# Altium footprint library connectors_socets.pcblib: 567 footprints (part 1 of 36)
Each footprint in its own frame and in the unit in brackets; x right, y up, seen from the top. Pads: shape width x height; smd on the part's side, far side on the other; paste and mask are expansions set on the pad; w line width, h text height; cw(c..) or ccw(c..) is an arc to the next point about the centre after c.
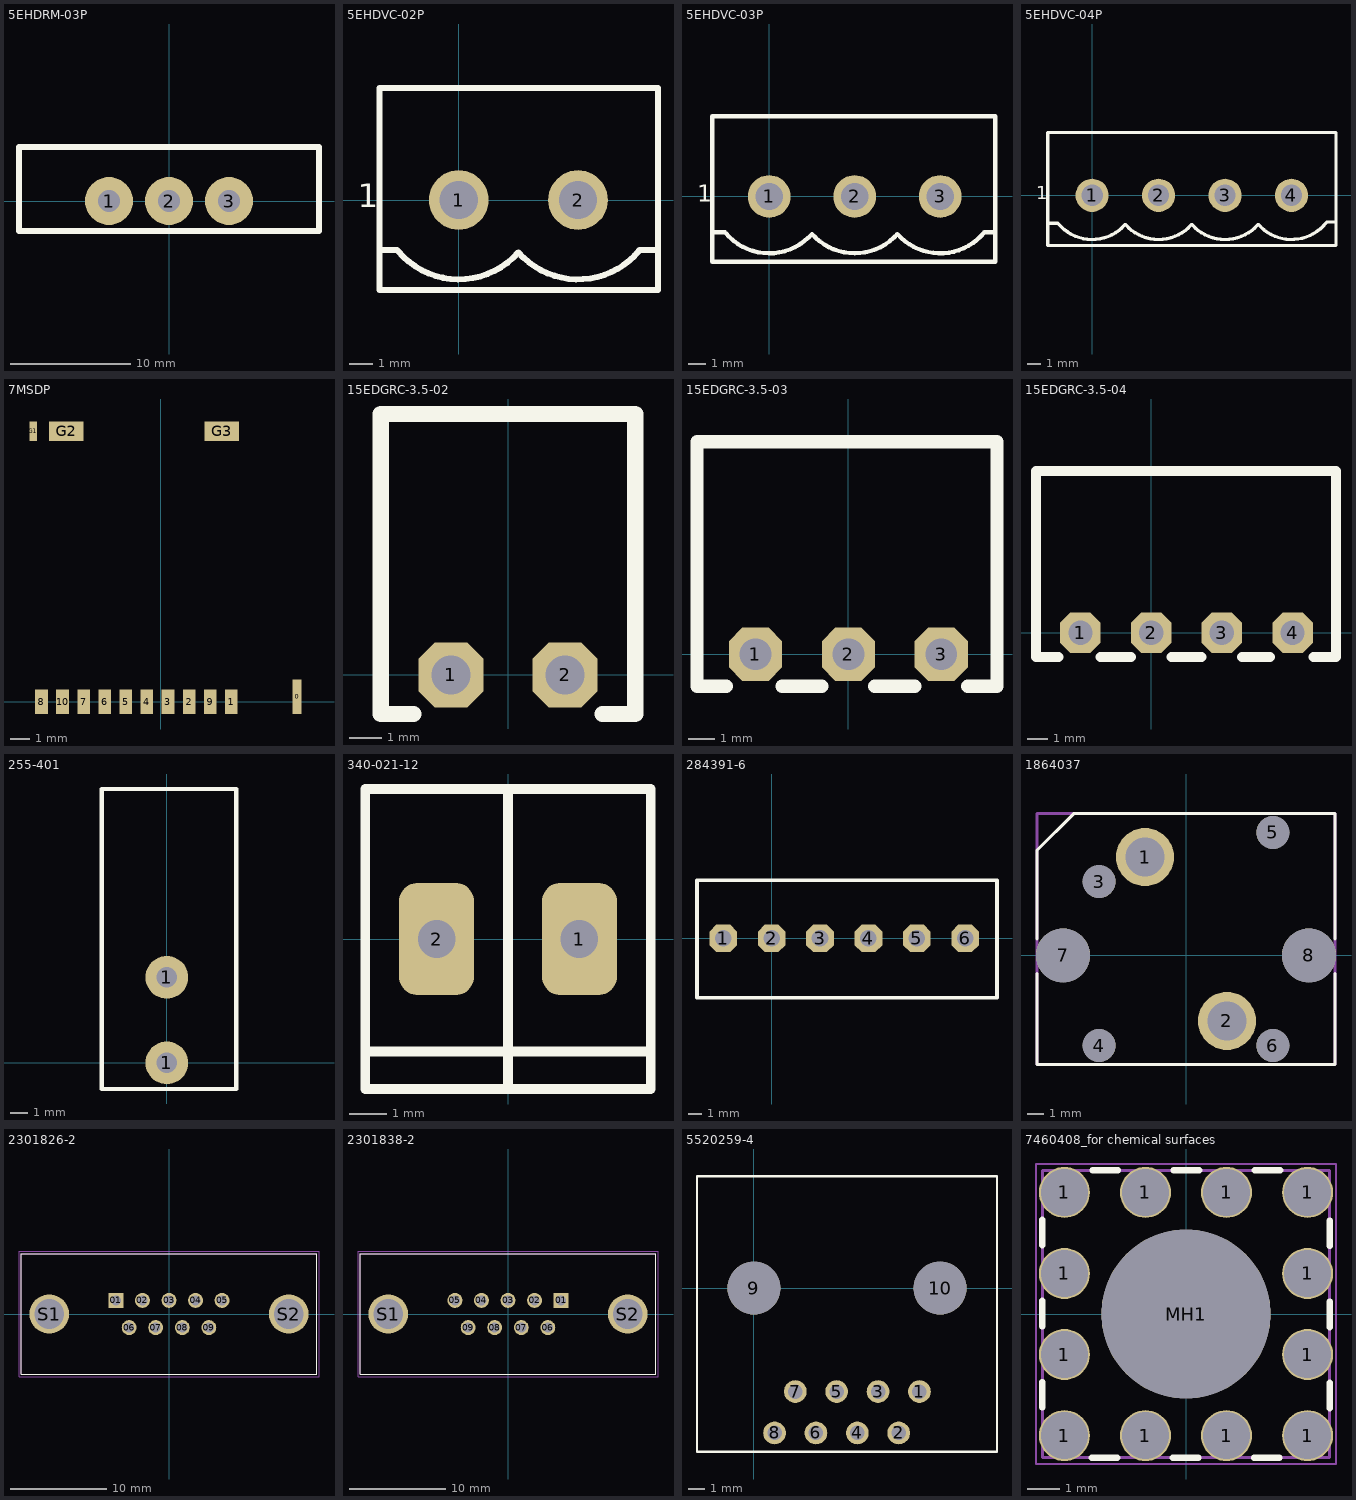
[diagram p0: the footprints below, top view; thin cyan lines are the x and y axes]

## 5EHDRM-03P [mm] "Connector 3Pin 5.00mm Pitch"
pads (3):
  round 4 hole 1.8: 1(-5,0) 2(0,0) 3(5,0)
Top Overlay:
  lines w0.5: -12.5,-2.5 -12.5,3.5 -12.5,4.5 12.5,4.5 12.5,3.5 12.5,-2.5 0,-2.5 -12.5,-2.5
3D body "terminal.stp": height 8.22, standoff -3.9, extent -12.525,-2.25 12.475,9.75

## 5EHDVC-02P [mm] "5mm 2 pins"
pads (2):
  round 2.5 hole 1.6: 1(0,0) 2(5,0)
Top Overlay:
  lines w0.254: -3.325,-2.101 -2.583,-2.101 ; -2.546,-2.139 ccw(c0,0) 2.5,-2.192 ccw(c5,0) 7.577,-2.101 8.35,-2.101 ; -3.325,-3.775 8.35,-3.775 8.35,4.7 -3.325,4.7 -3.325,-3.775
  text "1" at -4.223,-0.298 h1
3D body "5EHDVC-02P.stp": height 12.01, standoff -3.99, extent -3.3,-3.8 8.3,4.67

## 5EHDVC-03P [mm] "5mm 3 pins"
pads (3):
  round 2.5 hole 1.6: 1(0,0) 2(5,0) 3(10,0)
Top Overlay:
  lines w0.254: -3.325,-2.101 -2.583,-2.101 ; -2.546,-2.139 ccw(c0,0) 2.5,-2.192 ccw(c5,0) 7.5,-2.192 ccw(c10,0) 12.577,-2.101 13.225,-2.101 ; -3.325,-3.825 13.225,-3.825 13.225,4.7 -3.325,4.7 -3.325,-3.825
  text "1" at -4.223,-0.298 h1
3D body "5EHDVC-03P.stp": height 12.01, standoff -3.99, extent -3.325,-3.81 13.275,4.66

## 5EHDVC-04P [mm] "5mm 4 pins"
pads (4):
  round 2.5 hole 1.6: 1(0,0) 2(5,0) 3(10,0) 4(15,0)
Top Overlay:
  lines w0.254: -3.325,-2.101 -2.583,-2.101 ; -2.546,-2.139 ccw(c0,0) 2.5,-2.192 ccw(c5,0) 7.5,-2.192 ccw(c10,0) 12.5,-2.192 ccw(c15,0) 17.577,-2.101 ; 17.654,-2.011 18.302,-2.011 ; -3.325,-3.775 18.35,-3.775 18.35,4.725 -3.325,4.725 -3.325,-3.775
  text "1" at -4.223,-0.298 h1
3D body "5EHDVC-04P.stp": height 12.01, standoff -3.99, extent -3.275,-3.8 18.325,4.67

## 7MSDP [mm] "SD slot"
height 2.54
pads (14):
  rect 0.45x1.8 smd: 0(7.105,0.254)
  rect 0.66x1.27 smd: 1(3.675,0) 2(1.475,0) 3(0.375,0) 4(-0.725,0) 5(-1.825,0) 6(-2.925,0) 7(-4.025,0) 8(-6.225,0) 9(2.575,0) 10(-5.125,0)
  rect 0.4x1 smd: G1(-6.65,14.1)
  rect 1.8x1 smd: G2(-4.925,14.1) G3(3.175,14.1)
3D body "SD.stp": height 1.95, standoff 0, extent -7,-0.6 7.4,14.6

## 15EDGRC-3.5-02 [mm] "Connector 3.5mm pitch"
pads (2):
  oct 2x2 hole 1.2: 1(-1.75,0) 2(1.75,0)
Top Overlay:
  lines w0.5: -2.9,-1.2 -3.9,-1.2 -3.9,8 3.9,8 3.9,-1.2 2.9,-1.2
3D body "User Library-15EDGRC-3_5-2.step": height 7.2, standoff -3.4, extent -3.9,-1.2 3.9,8

## 15EDGRC-3.5-03 [mm] "Connector 3.5mm pitch"
pads (3):
  oct 2x2 hole 1.2: 1(-3.5,0) 2(0,0) 3(3.5,0)
Top Overlay:
  lines w0.5: -4.6,-1.2 -5.7,-1.2 -5.7,8 5.6,8 5.6,-1.2 4.5,-1.2 ; -2.5,-1.2 -1,-1.2 ; 1,-1.2 2.5,-1.2
3D body "User Library-15EDGRC-3_5-3.STEP": height 7.21, standoff -3.39, extent -5.65,-1.198 5.65,8.002

## 15EDGRC-3.5-04 [mm] "Connector 3.5mm pitch"
pads (4):
  oct 2x2 hole 1.2: 1(-3.5,0) 2(0,0) 3(3.5,0) 4(7,0)
Top Overlay:
  lines w0.5: -4.6,-1.2 -5.7,-1.2 -5.7,8 9.15,8 9.15,-1.2 8.05,-1.2 ; -2.5,-1.2 -1,-1.2 ; 1,-1.2 2.5,-1.2 ; 4.5,-1.2 5.875,-1.2
3D body "User Library-15EDGRC-3_5-3.STEP": height 2.8, standoff -7.8, extent -5.65,-1.2 5.65,8
3D body "User Library-15EDGRC-3_5-3.STEP": height 2.8, standoff -7.8, extent -2.15,-1.2 9.15,8

## 255-401 [mm] "wago 1 pin"
pads (2):
  round 2.5 hole 1.2: 1(0,0) 1(0,5)
Top Overlay:
  lines w0.254: -3.81,-1.524 0,-1.524 4.064,-1.524 4.064,16.002 -3.81,16.002 -3.81,-1.524
3D body "255-401.stp": height 14.74, standoff -4, extent -3.675,-1.275 4.125,16.042

## 340-021-12 [mm]
pads (2):
  rrect50% 2x3 hole 1: 1(1.905,0) 2(-1.905,0)
Top Overlay:
  lines w0.254: -3.8,-3 3.8,-3 ; 0,-3.9 0,0 0,4 ; -3.81,-4 -3.81,0 -3.81,4 3.81,4 3.81,0 3.81,-4 -3.81,-4
3D body "User Library-ARK2_3v81.step": height 8.5, standoff -3.5, extent -4,-3.75 3.81,3.75

## 284391-6 [mm] "Connector 3.5mm pitch"
pads (6):
  oct 2x2 hole 1.2: 1(-3.5,0) 2(0,0) 3(3.5,0) 4(7,0) 5(10.5,0) 6(14,0)
Top Overlay:
  lines w0.254: -5.4,-4.3 16.3,-4.3 16.3,4.2 -5.2,4.2 -5.4,4.2 -5.4,-4.3
3D body "c-284391-6-b-3d.stp": height 12.7, standoff -3.4, extent -5.25,-4.1 16.25,4.1

## 1864037 [mm]
pads (8):
  round 3.55 hole 2.4: 1(-2.5,6) 2(2.5,-4)
  round 2 hole 2 unplated: 3(-5.3,4.5) 4(-5.3,-5.5) 5(5.3,7.5) 6(5.3,-5.5)
  round 3.3 hole 3.3 unplated: 7(-7.5,0) 8(7.5,0)
Top Overlay:
  lines w0.2: -9.09,-1.1 -9.09,-6.65 9.09,-6.65 9.09,-1.1 ; -9.09,1 -9.09,6.41 -6.85,8.65 9.09,8.65 9.09,1
Plata3D:
  lines w0.2: -9.09,-6.65 -9.09,8.65 9.09,8.65 9.09,-6.65 -9.09,-6.65
3D body "1864037.stp": height 16.2, standoff -5, extent -9.15,-6.65 9.15,8.65

## 2301826-2 [mm]
pads (11):
  rect 1.56x1.56 hole 1.04: 01(-5.54,1.42)
  round 1.56 hole 1.04: 02(-2.77,1.42) 03(0,1.42) 04(2.77,1.42) 05(5.54,1.42) 06(-4.155,-1.42) 07(-1.385,-1.42) 08(1.385,-1.42) 09(4.155,-1.42)
  round 4.116 hole 3.1: S1(-12.495,0) S2(12.495,0)
Top Overlay:
  lines w0.127: -15.4,-6.275 -15.4,6.275 15.4,6.275 15.4,-6.275 -15.4,-6.275
Plata3D:
  lines w0.127: -15.4,-6.275 -15.4,6.275 15.4,6.275 15.4,-6.275 -15.4,-6.275
Board3D:
  lines w0.05: -15.65,-6.525 -15.65,6.525 15.65,6.525 15.65,-6.525 -15.65,-6.525
3D body "2301826-2.SLDPRT": height 12.9, standoff -4.25, extent -15.4,-6.275 15.4,6.275

## 2301838-2 [mm]
pads (11):
  rect 1.56x1.56 hole 1.04: 01(5.54,1.42)
  round 1.56 hole 1.04: 02(2.77,1.42) 03(0,1.42) 04(-2.77,1.42) 05(-5.54,1.42) 06(4.155,-1.42) 07(1.385,-1.42) 08(-1.385,-1.42) 09(-4.155,-1.42)
  round 4.116 hole 3.1: S1(-12.495,0) S2(12.495,0)
Top Overlay:
  lines w0.127: -15.4,-6.275 15.4,-6.275 15.4,6.275 -15.4,6.275 -15.4,-6.275
Plata3D:
  lines w0.127: -15.4,-6.275 15.4,-6.275 15.4,6.275 -15.4,6.275 -15.4,-6.275
Board3D:
  lines w0.05: -15.65,-6.525 15.65,-6.525 15.65,6.525 -15.65,6.525 -15.65,-6.525
3D body "2301838-2.SLDPRT": height 12.6, standoff -4.3, extent -15.39,-6.275 15.39,6.275

## 5520259-4 [mil]
pads (10):
  round 55 hole 35 mask+0: 1(400,-250) 2(350,-350) 3(300,-250) 4(250,-350) 5(200,-250) 6(150,-350) 7(100,-250) 8(50,-350)
  round 128 hole 128: 9(0,0) 10(450,0)
Top Overlay:
  lines w6: -137.5,-395 587.5,-395 587.5,270 -137.5,270 -137.5,-395
3D body "c-5520259-4-c-3d.stp": height 649.61, standoff -130.39, extent -133.09,-390.49 581.91,264.51

## 7460408_for chemical surfaces [mm] "M5, thr 6mm"
height 6
pads (13):
  round 1.6 hole 1.475: 1(-3.81,-3.81) 1(-3.81,-1.27) 1(-3.81,1.27) 1(-3.81,3.81) 1(-1.27,-3.81) 1(-1.27,3.81) 1(1.27,-3.81) 1(1.27,3.81) 1(3.81,-3.81) 1(3.81,-1.27) 1(3.81,1.27) 1(3.81,3.81)
  round 5.3 hole 5.3 unplated: MH1(0,0)
Top Overlay:
  lines w0.2: -4.5,-2.93 -4.5,-2.13 ; -4.5,-0.39 -4.5,0.41 ; -4.5,2.15 -4.5,2.95 ; -2.95,-4.5 -2.15,-4.5 ; -2.93,4.5 -2.13,4.5 ; -0.41,-4.5 0.39,-4.5 ; -0.39,4.5 0.41,4.5 ; 2.13,-4.5 2.93,-4.5 ; 2.15,4.5 2.95,4.5 ; 4.5,-2.95 4.5,-2.15 ; 4.5,-0.41 4.5,0.39 ; 4.5,2.13 4.5,2.93
Plata3D:
  lines w0.1: -4.5,-4.5 -4.5,4.5 4.5,4.5 4.5,-4.5 -4.5,-4.5
Board3D:
  lines w0.05: -0.5,0 0.5,0 ; 0,-0.5 0,0.5 ; -4.7,-4.7 -4.7,4.7 4.7,4.7 4.7,-4.7 -4.7,-4.7
3D body "7460408.stp": height 6, standoff -3.5, extent -4.5,-4.5 4.5,4.5